# Altium footprint library SMDLibrary.PcbLib: 309 footprints (part 11 of 20)
Each footprint in its own frame and in the unit in brackets; x right, y up, seen from the top. Pads: shape width x height; smd on the part's side, far side on the other; paste and mask are expansions set on the pad; w line width, h text height; cw(c..) or ccw(c..) is an arc to the next point about the centre after c.
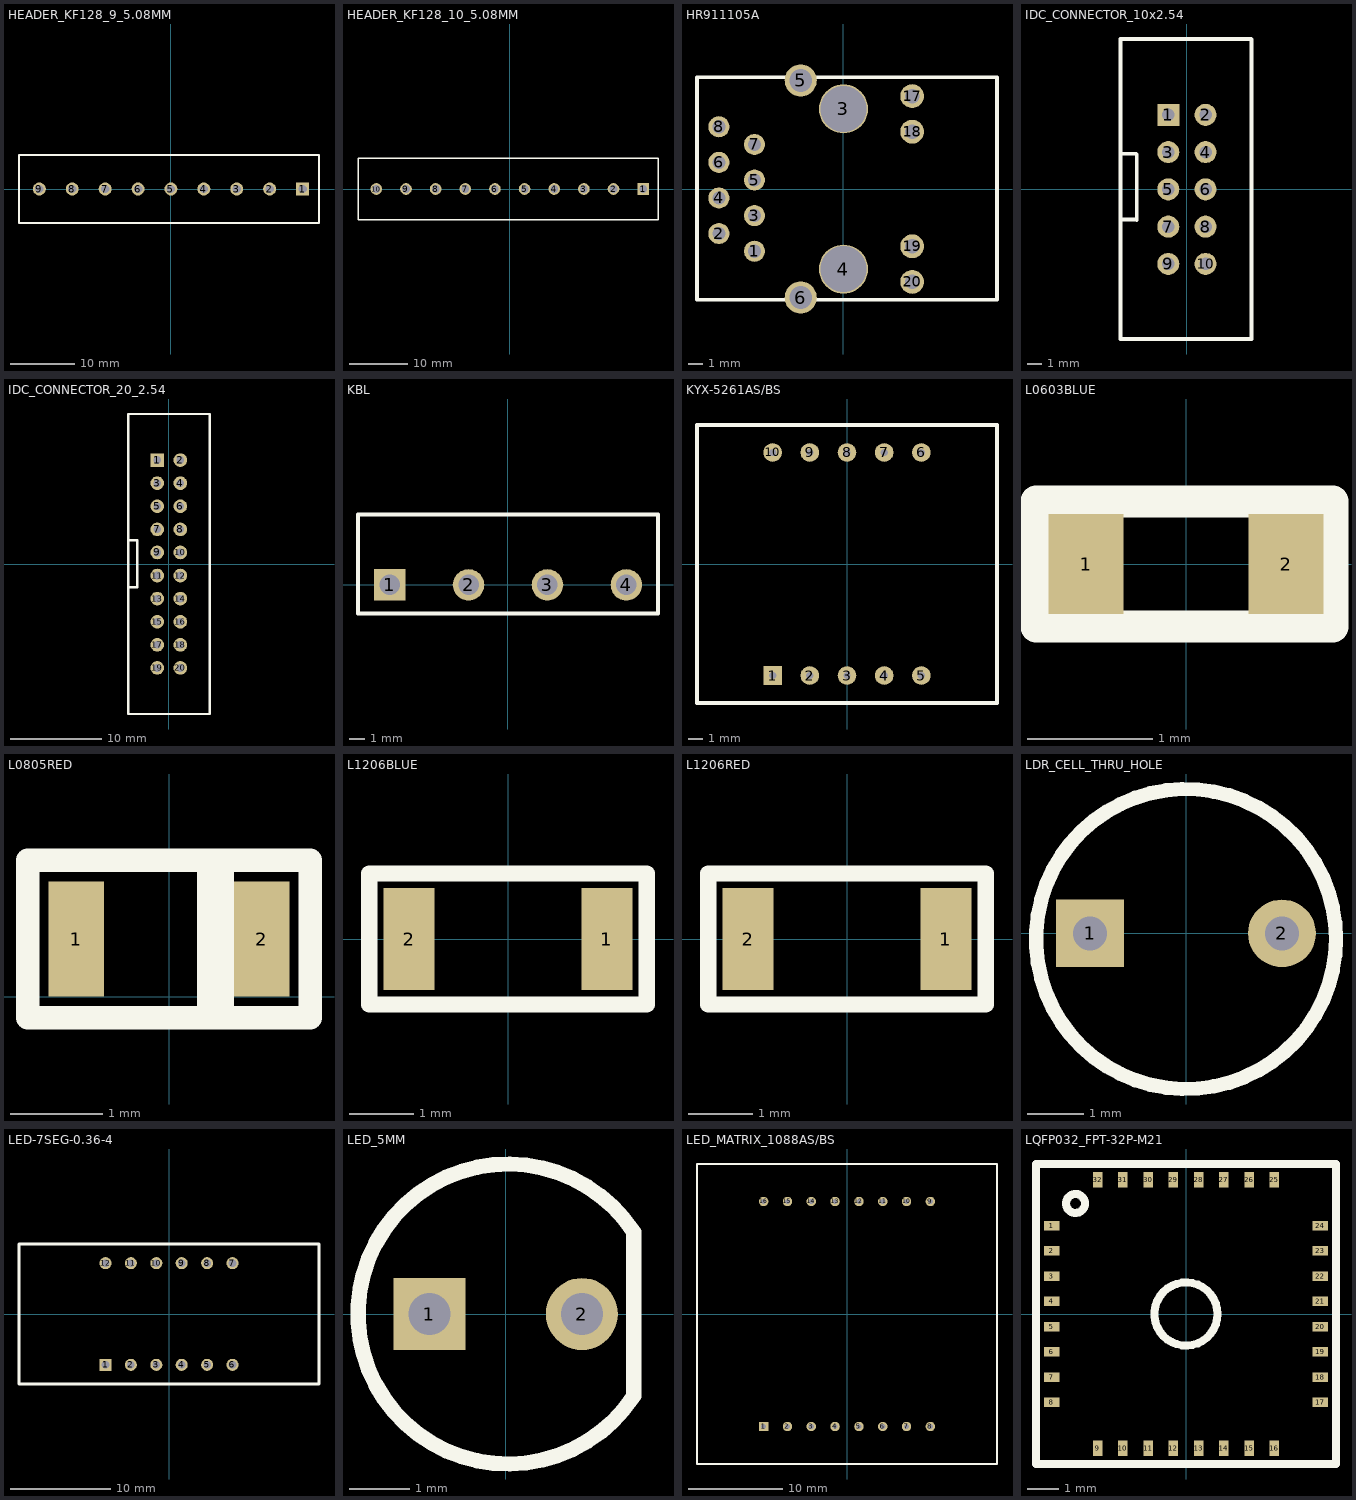
[diagram p10: the footprints below, top view; thin cyan lines are the x and y axes]

## HEADER_KF128_9_5.08MM [mm]
pads (9):
  rect 2x2 hole 1.3: 1(20.32,0)
  round 2 hole 1.3: 2(15.24,0) 3(10.16,0) 4(5.08,0) 5(0,0) 6(-5.08,0) 7(-10.16,0) 8(-15.24,0) 9(-20.32,0)
Top Overlay:
  lines w0.254: -23.46,5.25 -23.46,5.25 ; -23.46,5.25 -23.46,-5.25 22.86,-5.25 22.86,5.25 ; -23.46,5.25 22.86,5.25 ; 22.86,5.25 22.86,5.25
3D body "User Library-KF128.STEP": height 14.3, standoff -5, extent -23.46,-5.25 -17.78,5.25
3D body "User Library-KF128.STEP": height 14.3, standoff -5, extent -13.3,-5.25 -7.62,5.25
3D body "User Library-KF128.STEP": height 14.3, standoff -5, extent -8.22,-5.25 -2.54,5.25
3D body "User Library-KF128.STEP": height 14.3, standoff -5, extent -3.14,-5.25 2.54,5.25
3D body "User Library-KF128.STEP": height 14.3, standoff -5, extent 1.94,-5.25 7.62,5.25
3D body "User Library-KF128.STEP": height 14.3, standoff -5, extent 7.02,-5.25 12.7,5.25
3D body "User Library-KF128.STEP": height 14.3, standoff -5, extent 17.18,-5.25 22.86,5.25
3D body "User Library-KF128.STEP": height 14.3, standoff -5, extent 12.1,-5.25 17.78,5.25
3D body "User Library-KF128.STEP": height 14.3, standoff -5, extent -18.38,-5.25 -12.7,5.25

## HEADER_KF128_10_5.08MM [mm]
pads (10):
  rect 2x2 hole 1.3: 1(22.86,0)
  round 2 hole 1.3: 2(17.78,0) 3(12.7,0) 4(7.62,0) 5(2.54,0) 6(-2.54,0) 7(-7.62,0) 8(-12.7,0) 9(-17.78,0) 10(-22.86,0)
Top Overlay:
  lines w0.254: -26,5.25 25.4,5.25 ; -26,5.25 -26,-5.25 25.4,-5.25 25.4,5.25 ; -26,5.25 -26,5.25 ; 25.4,5.25 25.4,5.25
3D body "User Library-KF128.STEP": height 14.3, standoff -5, extent -26,-5.25 -20.32,5.25
3D body "User Library-KF128.STEP": height 14.3, standoff -5, extent -15.84,-5.25 -10.16,5.25
3D body "User Library-KF128.STEP": height 14.3, standoff -5, extent 14.64,-5.25 20.32,5.25
3D body "User Library-KF128.STEP": height 14.3, standoff -5, extent 19.72,-5.25 25.4,5.25
3D body "User Library-KF128.STEP": height 14.3, standoff -5, extent 9.56,-5.25 15.24,5.25
3D body "User Library-KF128.STEP": height 14.3, standoff -5, extent 4.48,-5.25 10.16,5.25
3D body "User Library-KF128.STEP": height 14.3, standoff -5, extent -0.6,-5.25 5.08,5.25
3D body "User Library-KF128.STEP": height 14.3, standoff -5, extent -5.68,-5.25 0,5.25
3D body "User Library-KF128.STEP": height 14.3, standoff -5, extent -10.76,-5.25 -5.08,5.25
3D body "User Library-KF128.STEP": height 14.3, standoff -5, extent -20.92,-5.25 -15.24,5.25

## HR911105A [mm]
pads (16):
  round 1.5 hole 0.93: 1(-6.35,-4.44) 2(-8.89,-3.18) 3(-6.35,-1.9) 4(-8.89,-0.64) 5(-6.35,0.64) 6(-8.89,1.9) 7(-6.35,3.18) 8(-8.89,4.44)
  round 3.5 hole 3.3: 3(0,5.715) 4(0,-5.715)
  round 2.3 hole 1.63: 5(-3.05,7.745) 6(-3.05,-7.745)
  round 1.7 hole 1.05: 17(4.9,6.625) 18(4.9,4.085) 19(4.9,-4.085) 20(4.9,-6.625)
Top Overlay:
  lines w0.254: -10.45,-7.9 -10.45,7.975 10.95,7.975 10.95,-7.9 -10.45,-7.9
3D body "User Library-HR911105A.STEP": height 13.5, standoff -3, extent -10.45,-7.9 10.95,7.98

## IDC_CONNECTOR_10x2.54 [mm]
pads (10):
  rect 1.5x1.5 hole 0.85: 1(-1.27,5.08)
  round 1.5 hole 0.85: 2(1.27,5.08) 3(-1.27,2.54) 4(1.27,2.54) 5(-1.27,0) 6(1.27,0) 7(-1.27,-2.54) 8(1.27,-2.54) 9(-1.27,-5.08) 10(1.27,-5.08)
Top Overlay:
  lines w0.254: -4.525,-2.06 -3.465,-2.06 -3.425,-2.1 -3.425,2.4 -3.451,2.426 -4.525,2.426 ; -4.525,-10.2 -4.525,-10.175 -4.525,10.25 4.363,10.25 4.387,10.225 4.4,10.213 4.4,-10.2 4.375,-10.2 -4.525,-10.2
3D body "DS1013-10S (IDC-10MS CONNFLY).stp": height 3.1, standoff -9.5, extent -4.5,-10.25 4.4,10.25

## IDC_CONNECTOR_20_2.54 [mm]
pads (20):
  rect 1.5x1.5 hole 0.85: 1(-1.27,11.43)
  round 1.5 hole 0.85: 2(1.27,11.43) 3(-1.27,8.89) 4(1.27,8.89) 5(-1.27,6.35) 6(1.27,6.35) 7(-1.27,3.81) 8(1.27,3.81) 9(-1.27,1.27) 10(1.27,1.27) 11(-1.27,-1.27) 12(1.27,-1.27) 13(-1.27,-3.81) 14(1.27,-3.81) 15(-1.27,-6.35) 16(1.27,-6.35) 17(-1.27,-8.89) 18(1.27,-8.89) 19(-1.27,-11.43) 20(1.27,-11.43)
Top Overlay:
  lines w0.254: -4.3,-2.55 -3.475,-2.55 -3.475,2.625 -4.3,2.625 ; -4.45,-16.5 4.5,-16.5 4.5,16.5 -4.45,16.5 -4.45,-16.5
3D body "DS1013-20S (IDC-20MS CONNFLY).stp": height 9, standoff -3.6, extent -4.475,-16.6 4.425,16.6

## KBL [mm]
pads (4):
  rect 2x2 hole 1.3: 1(-7.5,0)
  round 2 hole 1.3: 2(-2.5,0) 3(2.5,0) 4(7.5,0)
Top Overlay:
  lines w0.254: -9.5,-1.8 -9.5,4.45 9.5,4.45 9.5,-1.8 -9.5,-1.8
3D body "KBL410.sldprt": height 15.7, standoff -3, extent -9.5,-1.8 9.5,4.45

## KYX-5261AS/BS [mm] "0.56inch 2digits red 7 segment led display 10pin"
pads (10):
  rect 1.27x1.27 hole 0.51: 1(-5.08,-7.62)
  round 1.27 hole 0.51: 2(-2.54,-7.62) 3(0,-7.62) 4(2.54,-7.62) 5(5.08,-7.62) 6(5.08,7.62) 7(2.54,7.62) 8(0,7.62) 9(-2.54,7.62) 10(-5.08,7.62)
Top Overlay:
  lines w0.254: -10.25,-9.5 -10.25,9.5 10.25,9.5 10.25,-9.5 -10.16,-9.5

## L0603BLUE [mm]
pads (2):
  rect 0.6x0.8 smd: 1(-0.8,0) 2(0.8,0)
Top Overlay:
  lines w0.254: -1.2,-0.5 1.175,-0.5 1.175,0.5 -1.2,0.5 -1.2,-0.5
3D body "User Library-SMD LED 0603.STEP": height 0.38, standoff -0.01, extent -0.8,-0.4 0.8,0.4

## L0805RED [mm]
pads (2):
  rect 0.6x1.24 smd: 1(-1,0.625) 2(1,0.625)
Top Overlay:
  rectangle: 0.3,-0.125 0.7,1.375
  lines w0.254: -1.525,-0.225 1.525,-0.225 1.525,1.475 -1.525,1.475 -1.525,-0.225
3D body "everlight-17-21-0805LED-red.STEP": height 1.1, standoff -0.01, extent -1,0 1,1.25

## L1206BLUE [mm]
pads (2):
  rect 0.8x1.6 smd: 1(1.55,0) 2(-1.55,0)
Top Overlay:
  lines w0.254: -2.175,-1.025 -2.175,1.025 2.175,1.025 2.175,-1.025 -2.175,-1.025
3D body "User Library-LED 1206 BLUE.STEP": height 1.1, standoff 0, extent -1.6,-0.8 1.6,0.8

## L1206RED [mm]
pads (2):
  rect 0.8x1.6 smd: 1(1.55,0) 2(-1.55,0)
Top Overlay:
  lines w0.254: -2.175,-1.025 2.175,-1.025 2.175,1.025 -2.175,1.025 -2.175,-1.025
3D body "User Library-LED 1206 RED.STEP": height 1.1, standoff 0, extent -1.6,-0.8 1.6,0.8

## LDR_CELL_THRU_HOLE [mm]
pads (2):
  rect 1.2x1.2 hole 0.6: 1(-1.7,0)
  round 1.2 hole 0.6: 2(1.7,0)
Top Overlay:
  circle w0.254: c0,-0.1 r2.657
3D body "LDR_pcb_TH.SLDPRT": height 2.02, standoff -3, extent -2.55,-2.15 2.55,2.15

## LED-7SEG-0.36-4 [mm]
pads (12):
  rect 1.2x1.2 hole 0.762: 1(-6.35,-5.08)
  round 1.2 hole 0.762: 2(-3.81,-5.08) 3(-1.27,-5.08) 4(1.27,-5.08) 5(3.81,-5.08) 6(6.35,-5.08) 7(6.35,5.08) 8(3.81,5.08) 9(1.27,5.08) 10(-1.27,5.08) 11(-3.81,5.08) 12(-6.35,5.08)
Top Overlay:
  lines w0.254: -15,-7 15,-7 15,7 -15,7 -15,-7

## LED_5MM [mm]
pads (2):
  rect 1.2x1.2 hole 0.7: 1(-1.27,0)
  round 1.2 hole 0.7: 2(1.27,0)
Top Overlay:
  lines w0.254: 2.132,-1.364 cw(c0.039,0.001) 2.132,1.365 2.132,-1.364
3D body "5mm LED.STEP": height 8.6, standoff -27, extent -2.95,-2.95 2.5,2.95

## LED_MATRIX_1088AS/BS [mm]
pads (16):
  rect 1x1 hole 0.55: 1(-8.89,-12)
  round 1 hole 0.55: 2(-6.35,-12) 3(-3.81,-12) 4(-1.27,-12) 5(1.27,-12) 6(3.81,-12) 7(6.35,-12) 8(8.89,-12) 9(8.89,12) 10(6.35,12) 11(3.81,12) 12(1.27,12) 13(-1.27,12) 14(-3.81,12) 15(-6.35,12) 16(-8.89,12)
Top Overlay:
  lines w0.254: -16,-16 16,-16 16,16 -16,16 -16,-16
3D body "User Library-User Library-Bicolor-LED-Matrix.STEP": height 8, standoff -6, extent -16,-16 16,16

## LQFP032_FPT-32P-M21 [mm]
pads (32):
  rect 0.5x0.3 smd: 1(-4.25,2.8) 2(-4.25,2) 3(-4.25,1.2) 4(-4.25,0.4) 5(-4.25,-0.4) 6(-4.25,-1.2) 7(-4.25,-2) 8(-4.25,-2.8) 17(4.25,-2.8) 18(4.25,-2) 19(4.25,-1.2) 20(4.25,-0.4) 21(4.25,0.4) 22(4.25,1.2) 23(4.25,2) 24(4.25,2.8)
  rect 0.3x0.5 smd: 9(-2.8,-4.25) 10(-2,-4.25) 11(-1.2,-4.25) 12(-0.4,-4.25) 13(0.4,-4.25) 14(1.2,-4.25) 15(2,-4.25) 16(2.8,-4.25) 25(2.8,4.25) 26(2,4.25) 27(1.2,4.25) 28(0.4,4.25) 29(-0.4,4.25) 30(-1.2,4.25) 31(-2,4.25) 32(-2.8,4.25)
Top Overlay:
  circle w0.254: c0,0 r1
  circle w0.254: c-3.5,3.5 r0.3
  lines w0.254: -4.75,-4.75 4.75,-4.75 4.75,4.75 -4.75,4.75 -4.75,-4.75
3D body "LQFP32_FPT-32P-M21.stp": height 1.5, standoff 0, extent -4.5,-4.5 4.5,4.5